# Altium schematic symbol library 724452_RPL-HX_Mobile_AEP_Rev0p91_Library.SchLib: 162 symbols (part 1 of 5) (continued)
## C_FERRITE (continued)
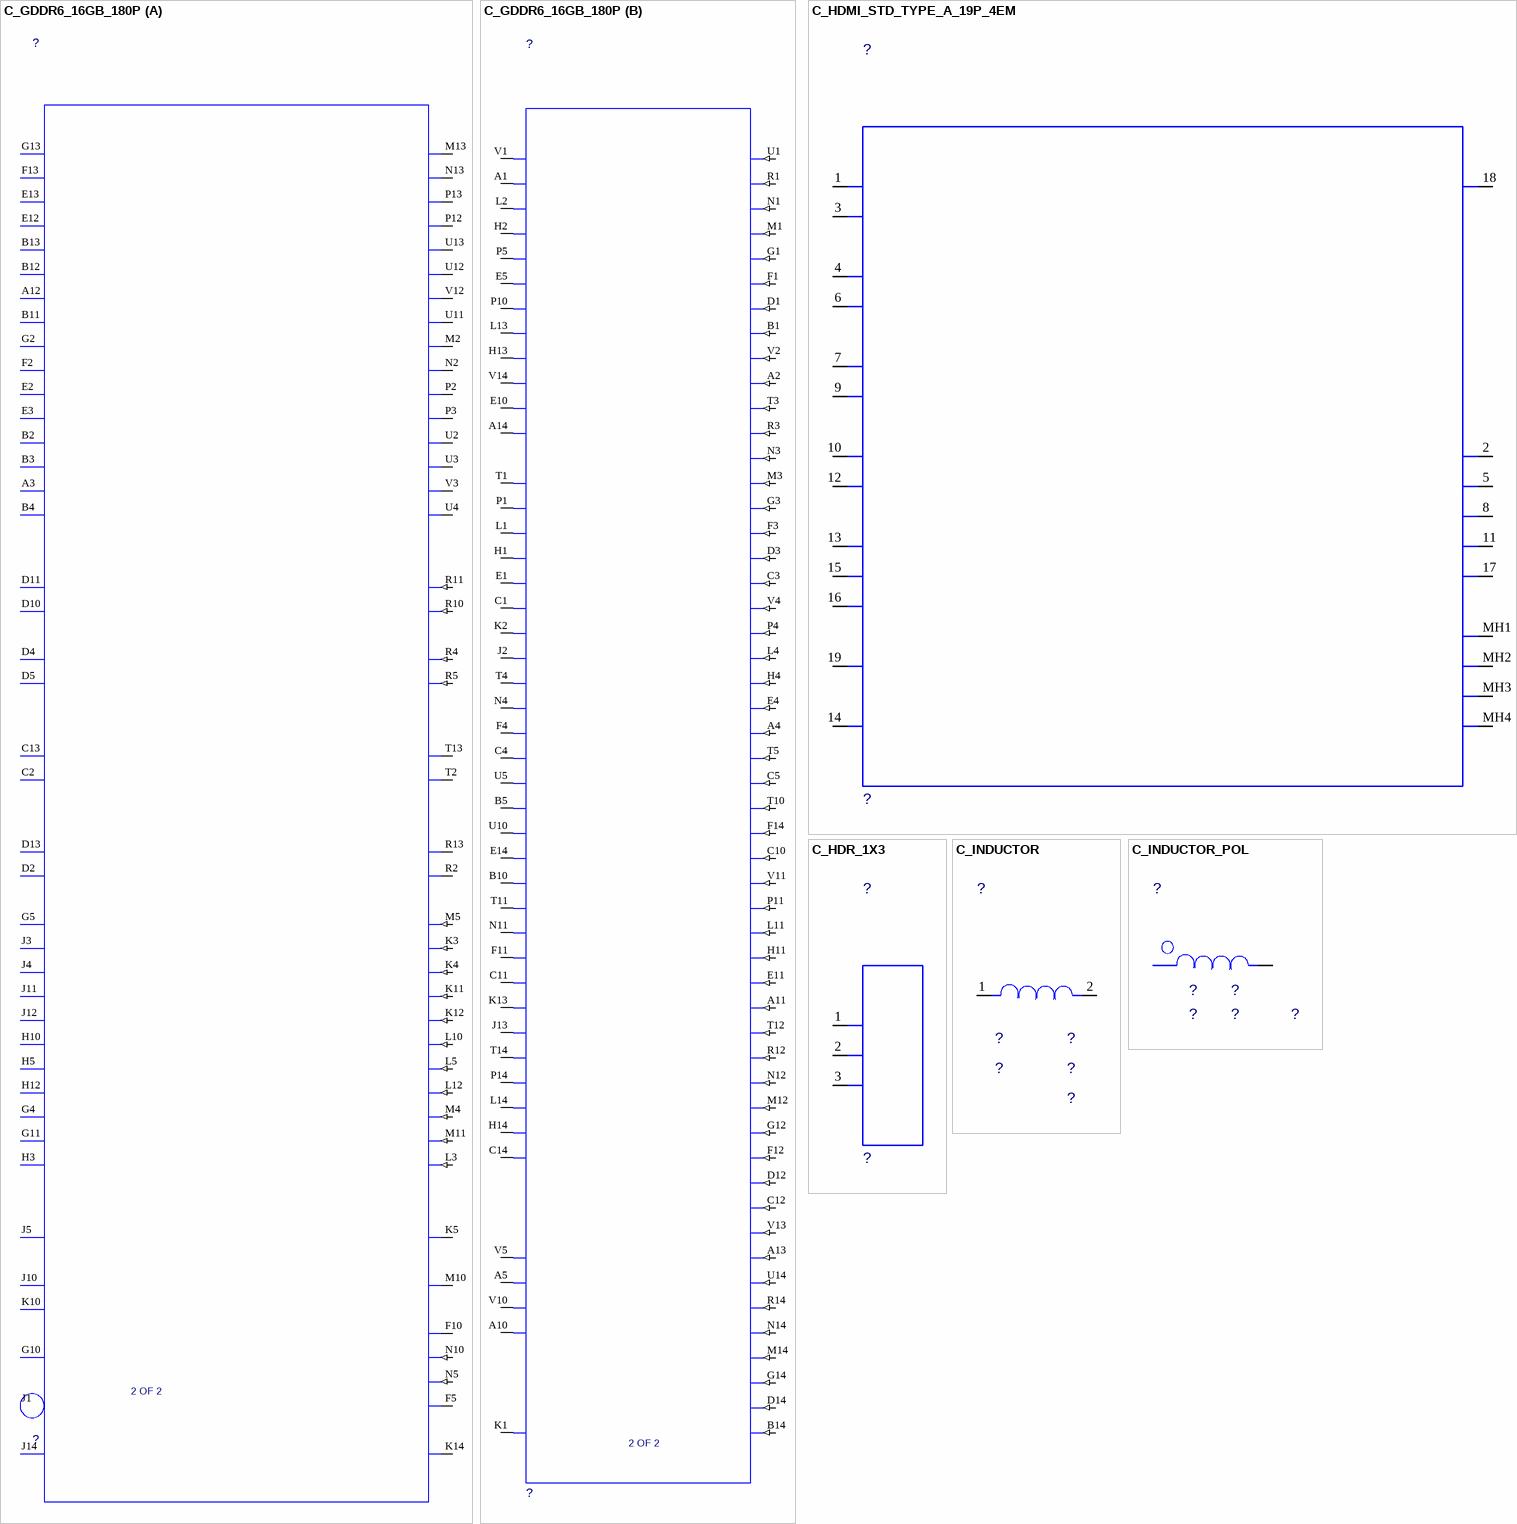
[diagram p5: symbols C_GDDR6_16GB_180P to C_INDUCTOR_POL]

## C_GDDR6_16GB_180P
designator ?  PART_SYM_NUM: 2 OF 2  (hidden comment: C_GDDR6_16GB_180P)
CDS_LMAN_SYM_OUTLINE: -250,1400,200,-1350; ROOM: NONE; OriginalSymbolOrigin: (-275,1400); FP_TECH: ?; IP: ?; MATERIAL: ?; PACK_TYPE: ?; PART_NUMBER: ?; VARIANT: ?
part A pins: A3 DQ01_A (io), A12 DQ09_A (io), B2 DQ03_A (io), B3 DQ02_A (io), B4 DQ00_A (io), B11 DQ08_A (io), B12 DQ10_A (io), B13 DQ11_A (io), C2 EDC0_A (io), C13 EDC1_A (io), D2 DBI0_N_A (io), D4 WCK0_T_A (in), D5 WCK0_C_A (in), D10 WCK1_C_A (in), D11 WCK1_T_A (in), D13 DBI1_N_A (io), E2 DQ05_A (io), E3 DQ04_A (io), E12 DQ12_A (io), E13 DQ13_A (io), F2 DQ06_A (io), F5 TMS (io), F10 TDI (io), F13 DQ14_A (io), G2 DQ07_A (io), G4 CA2_A (in), G5 CA10_A_NC (in), G10 CKE_N_A (io), G11 CA1_A (in), G13 DQ15_A (io), H3 CA0_A (in), H5 CA4_A (in), H10 CA5_A (in), H12 CA3_A (in), J1 RESET_N (io), J3 CA9_A (in), J4 CA8_A (in), J5 CABI_N_A (io), J10 CK_T (in), J11 CA7_A (in), J12 CA6_A (in), J14 ZQ_A (io), K3 CA9_B (in), K4 CA8_B (in), K5 CABI_N_B (io), K10 CK_C (in), K11 CA7_B (in), K12 CA6_B (in), K14 ZQ_B (io), L3 CA0_B (in), L5 CA4_B (in), L10 CA5_B (in), L12 CA3_B (in), M2 DQ07_B (io), M4 CA2_B (in), M5 CA10_B_NC (in), M10 CKE_N_B (io), M11 CA1_B (in), M13 DQ15_B (io), N2 DQ06_B (io), N5 TCK (in), N10 TDO (in), N13 DQ14_B (io), P2 DQ05_B (io), P3 DQ04_B (io), P12 DQ12_B (io), P13 DQ13_B (io), R2 DBI0_N_B (io), R4 WCK0_T_B (in), R5 WCK0_C_B (in), R10 WCK1_C_B (in), R11 WCK1_T_B (in), R13 DBI1_N_B (io), T2 EDC0_B (io), T13 EDC1_B (io), U2 DQ03_B (io), U3 DQ02_B (io), U4 DQ00_B (io), U11 DQ08_B (io), U12 DQ10_B (io), U13 DQ11_B (io), V3 DQ01_B (io), V12 DQ09_B (io)
part B pins: A1 VDD_02 (power), A2 VSS_10 (in), A4 VSS_24 (in), A5 VPP_02 (power), A10 VPP_04 (power), A11 VSS_35 (in), A13 VSS_45 (in), A14 VDD_12 (power), B1 VSS_08 (in), B5 VDDQ_14 (power), B10 VDDQ_17 (power), B14 VSS_52 (in), C1 VDDQ_06 (power), C3 VSS_18 (in), C4 VDDQ_12 (power), C5 VSS_26 (in), C10 VSS_29 (in), C11 VDDQ_21 (power), C12 VSS_43 (in), C14 VDDQ_28 (power), D1 VSS_07 (in), D3 VSS_17 (in), D12 VSS_42 (in), D14 VSS_51 (in), E1 VDDQ_05 (power), E4 VSS_23 (in), E5 VDD_06 (power), E10 VDD_11 (power), E11 VSS_34 (in), E14 VDDQ_16 (power), F1 VSS_06 (in), F3 VSS_16 (in), F4 VDDQ_11 (power), F11 VDDQ_20 (power), F12 VSS_41 (in), F14 VSS_28 (in), G1 VSS_05 (in), G3 VSS_15 (in), G12 VSS_40 (in), G14 VSS_50 (in), H1 VDDQ_04 (power), H2 VDD_04 (power), H4 VSS_22 (in), H11 VSS_33 (in), H13 VDD_09 (power), H14 VDDQ_27 (power), J2 VDDQ_08 (power), J13 VDDQ_23 (power), K1 VREFC (power), K2 VDDQ_07 (power), K13 VDDQ_22 (power), L1 VDDQ_03 (power), L2 VDD_03 (power), L4 VSS_21 (in), L11 VSS_32 (in), L13 VDD_08 (power), L14 VDDQ_26 (power), M1 VSS_04 (in), M3 VSS_14 (in), M12 VSS_39 (in), M14 VSS_49 (in), N1 VSS_03 (in), N3 VSS_13 (in), N4 VDDQ_10 (power), N11 VDDQ_19 (power), N12 VSS_38 (in), N14 VSS_48 (in), P1 VDDQ_02 (power), P4 VSS_20 (in), P5 VDD_05 (power), P10 VDD_07 (power), P11 VSS_31 (in), P14 VDDQ_25 (power), R1 VSS_02 (in), R3 VSS_12 (in), R12 VSS_37 (in), R14 VSS_47 (in), T1 VDDQ_01 (power), T3 VSS_11 (in), T4 VDDQ_09 (power), T5 VSS_25 (in), T10 VSS_27 (in), T11 VDDQ_18 (power), T12 VSS_36 (in), T14 VDDQ_24 (power), U1 VSS_01 (in), U5 VDDQ_13 (power), U10 VDDQ_15 (power), U14 VSS_46 (in), V1 VDD_01 (power), V2 VSS_09 (in), V4 VSS_19 (in), V5 VPP_01 (power), V10 VPP_03 (power), V11 VSS_30 (in), V13 VSS_44 (in), V14 VDD_10 (power)

## C_HDMI_STD_TYPE_A_19P_4EM
designator ?  (value not drawn)
CDS_LMAN_SYM_OUTLINE: -500,550,500,-550; ROOM: NONE; OriginalSymbolOrigin: (-525,550); FP_TECH: ?; IP: ?; PACK_TYPE: ?; VARIANT: ?; MATERIAL: ?; PART_NUMBER: ?
pins: 1 TMDS_DATA2_DP (io), 2 TMDS_DATA2_SHIELD (io), 3 TMDS_DATA2_DN (io), 4 TMDS_DATA1_DP (io), 5 TMDS_DATA1_SHIELD (io), 6 TMDS_DATA1_DN (io), 7 TMDS_DATA0_DP (io), 8 TMDS_DATA0_SHIELD (io), 9 TMDS_DATA0_DN (io), 10 TMDS_CLK_DP (io), 11 TMDS_CLK_SHIELD (io), 12 TMDS_CLK_DN (io), 13 CEC (io), 14 RESERVED_UTILITY_HEAC_P (io), 15 SCL (io), 16 SDA (io), 17 DDC_HEC_CEC_GND (io), 18 5V_P (power), 19 HOT_PLUG_DETECT_HEC_DATA_M (io), MH1 (io), MH2 (io), MH3 (io), MH4 (io)

## C_HDR_1X3
designator ?  (value not drawn)
CDS_LMAN_SYM_OUTLINE: -50,150,50,-150; ROOM: NONE; OriginalSymbolOrigin: (-75,150); FP_TECH: ?; IP: ?; MATERIAL: ?; PACK_TYPE: ?; PART_NUMBER: ?; VARIANT: ?
pins: 1 IO1 (io), 2 IO2 (io), 3 IO3 (io)

## C_INDUCTOR
designator ?, comment ?
CDS_LMAN_SYM_OUTLINE: -100,50,100,-50; ROOM: NONE; OriginalSymbolOrigin: (-75,25); CURRENT: ?; FP_TECH: ?; IP: ?; MATERIAL: ?; PACK_TYPE: ?; PART_NUMBER: ?; TOLERANCE: ?; VARIANT: ?
pins: 1 INA (io), 2 INB (io)

## C_INDUCTOR_POL
designator ?, comment ?
CDS_LMAN_SYM_OUTLINE: -100,50,100,-50; ROOM: NONE; OriginalSymbolOrigin: (-100,50); CURRENT: ?; FP_TECH: ?; IP: ?; MATERIAL: ?; PACK_TYPE: ?; PART_NUMBER: ?; TOLERANCE: ?; VARIANT: ?
pins: 1 A (io), 2 B (io)

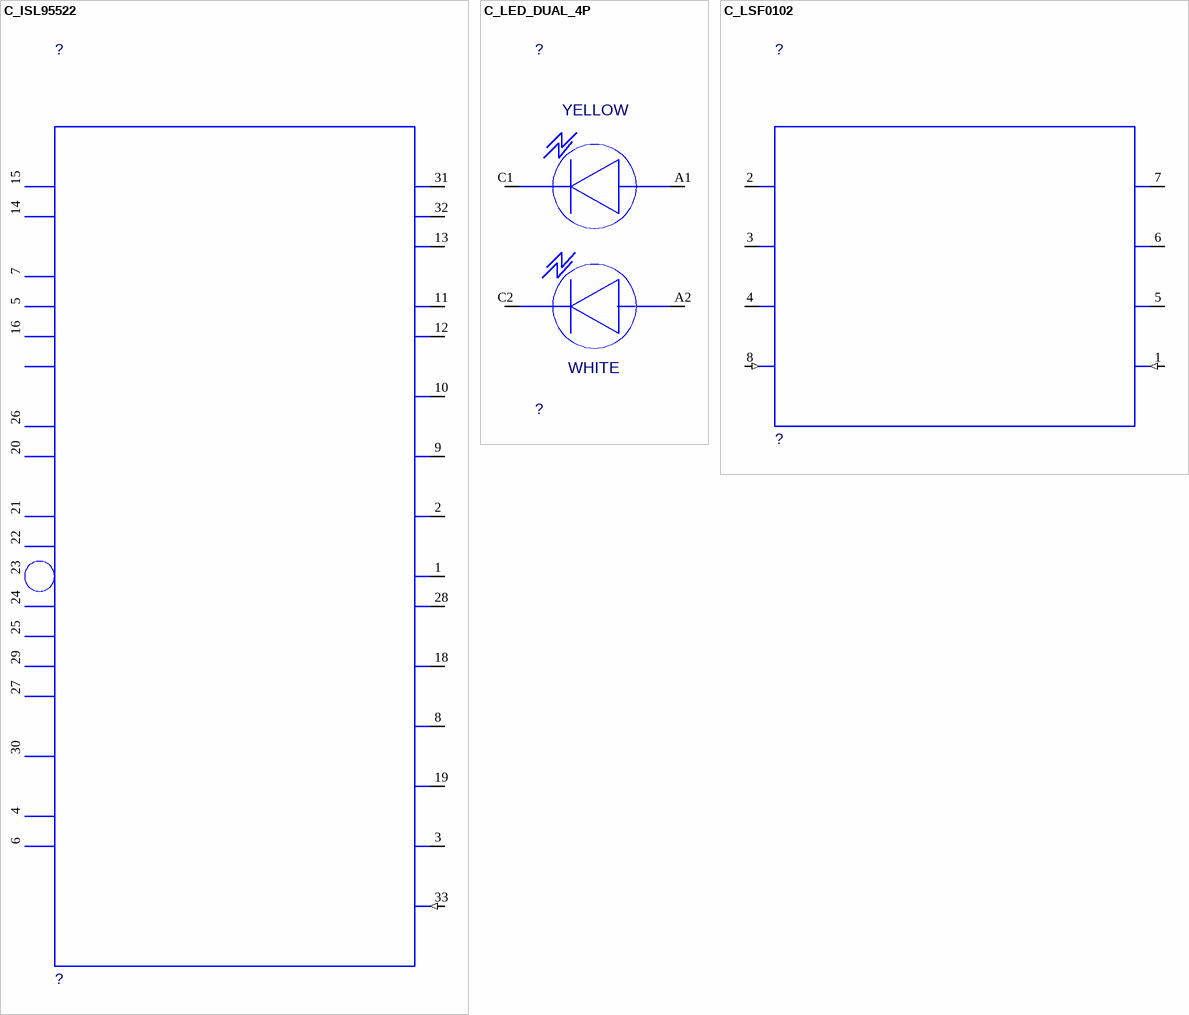
[diagram p6: symbols C_ISL95522 to C_LSF0102]

## C_ISL95522
designator ?  (value not drawn)
CDS_LMAN_SYM_OUTLINE: -300,700,300,-700; ROOM: NONE; OriginalSymbolOrigin: (-350,700); FP_TECH: ?; IP: ?; MATERIAL: ?; PACK_TYPE: ?; PART_NUMBER: ?; VARIANT: ?
pins: 1 CSON (io), 2 CSOP (io), 3 FSET (io), 4 QPCP (io), 5 CMSRC (io), 6 QPCN (io), 7 ASGATE (io), 8 VDDP (power), 9 LGATE (io), 10 PHASE (io), 11 UGATE (io), 12 BOOT (power), 13 NTC (io), 14 CSIN (io), 15 CSIP (io), 16 ACIN (io), 17 DCIN (power) hidden to DCIN, 18 VDD (power), 19 PROG (io), 20 ACLIM (io), 21 SDA (io), 22 SCL (io), 23 PROCHOT_N (io), 24 ACOK (io), 25 BATGONE (io), 26 CCLIM (io), 27 BMON (io), 28 COMP (io), 29 AMON (io), 30 PSYS (io), 31 VBAT (power), 32 BGATE (io), 33 GND_TPD (in)

## C_LED_DUAL_4P
designator ?  (value not drawn)
CDS_LMAN_SYM_OUTLINE: -100,250,100,-250; ROOM: NONE; OriginalSymbolOrigin: (-125,200); FP_TECH: ?; IP: ?; MATERIAL: ?; PACK_TYPE: ?; PART_NUMBER: ?; VARIANT: ?
pins: A1 CA1 (io), A2 CA2 (io), C1 CC1 (io), C2 CC2 (io)
text: YELLOW; WHITE

## C_LSF0102
designator ?  (value not drawn)
CDS_LMAN_SYM_OUTLINE: -300,250,300,-250; ROOM: NONE; OriginalSymbolOrigin: (-325,250); FP_TECH: ?; IP: ?; MATERIAL: ?; PACK_TYPE: ?; PART_NUMBER: ?; VARIANT: ?
pins: 1 GND (in), 2 VREF_A (power), 3 A1 (io), 4 A2 (io), 5 B2 (io), 6 B1 (io), 7 VREF_B (power), 8 EN (in)

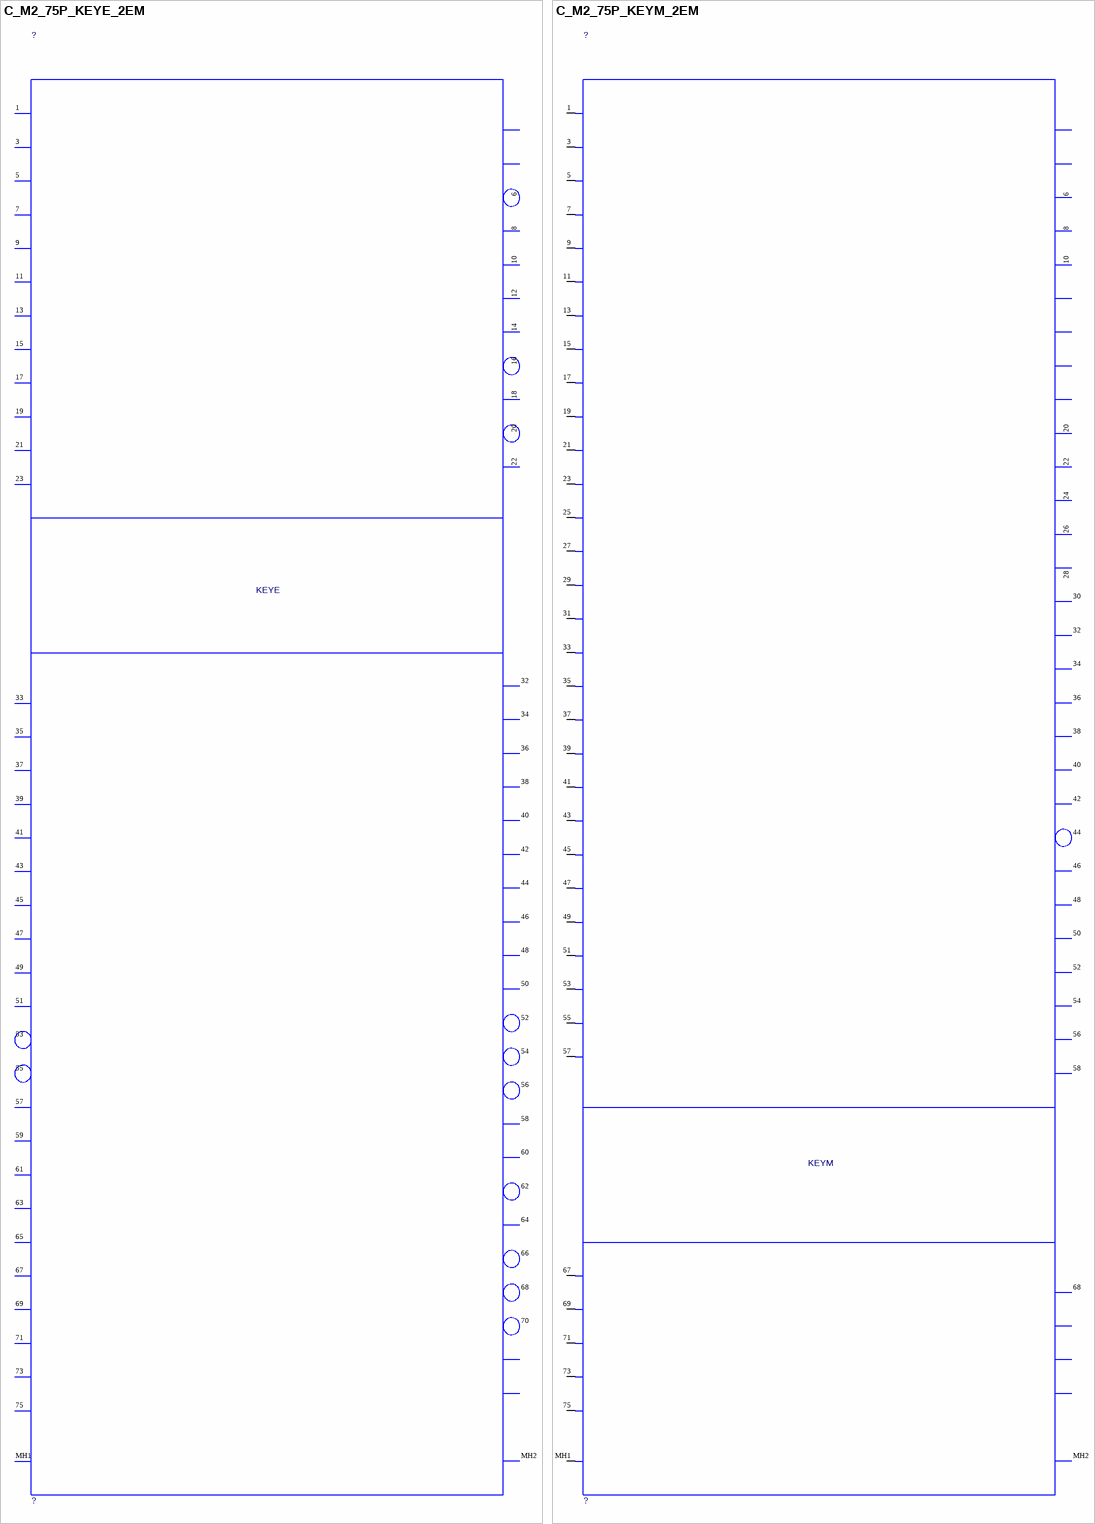
[diagram p7: symbols C_M2_75P_KEYE_2EM to C_M2_75P_KEYM_2EM]

## C_M2_75P_KEYE_2EM
designator ?  (value not drawn)
CDS_LMAN_SYM_OUTLINE: -700,2100,700,-2100; ROOM: NONE; OriginalSymbolOrigin: (-750,2100); FP_TECH: ?; IP: ?; MATERIAL: ?; PACK_TYPE: ?; PART_NUMBER: ?; VARIANT: ?
pins: 1 GND_1 (io), 2 3P3V_2 (power) hidden to 3P3V_2, 3 USB_DP (io), 4 3P3V_4 (power) hidden to 3P3V_4, 5 USB_DN (io), 6 LED_1_N (io), 7 GND_7 (io), 8 PCM_CLK_I2S_SCK (io), 9 SDIO_CLK_SYSCLK (io), 10 PCM_SYNC_I2S_WS (io), 11 SDIO_CMD (io), 12 PCM_IN_I2S_SD_IN (io), 13 SDIO_DATA0 (io), 14 PCM_OUT_I2S_SD_OUT (io), 15 SDIO_DATA1 (io), 16 LED_2_N (io), 17 SDIO_DATA2 (io), 18 GND_18 (io), 19 SDIO_DATA3 (io), 20 UART_WAKE_N (io), 21 SDIO_WAKE_N (io), 22 UART_RXD (io), 23 SDIO_RESET_TX_BLANKING_N (io), 32 UART_TXD (io), 33 GND_33 (io), 34 UART_CTS (io), 35 PETP0 (io), 36 UART_RTS (io), 37 PETN0 (io), 38 VENDOR_DEFINED_38 (io), 39 GND_39 (io), 40 VENDOR_DEFINED_40 (io), 41 PERP0 (io), 42 VENDOR_DEFINED_42 (io), 43 PERN0 (io), 44 COEX3 (io), 45 GND_45 (io), 46 COEX_RXD (io), 47 REFCLKP0 (io), 48 COEX_TXD (io), 49 REFCLKN0 (io), 50 SUSCLK (io), 51 GND_51 (io), 52 PERST0_N (io), 53 CLKREQ0_N (io), 54 W_DISABLE2_N (io), 55 PEWAKE0_N (io), 56 W_DISABLE1_N (io), 57 GND_57 (io), 58 I2C_DATA (io), 59 RESERVED_PETP1 (io), 60 I2C_CLK (io), 61 RESERVED_PETN1 (io), 62 ALERT_N (io), 63 GND_63 (io), 64 RESERVED (io), 65 RESERVED_PERP1 (io), 66 UIM_SWP_PERST1_N (io), 67 RESERVED_PERN1 (io), 68 UIM_POWER_SNK_CLKREQ1_N (io), 69 GND_69 (io), 70 UIM_POWER_SRC_GPIO_1_PEWAKE1_N (io), 71 RESERVED_REFCLKP1 (io), 72 3P3V_72 (power) hidden to 3P3V_72, 73 RESERVED_REFCLKN1 (io), 74 3P3V_74 (power) hidden to 3P3V_74, 75 GND_75 (io), MH1 (io), MH2 (io)
text: KEYE

## C_M2_75P_KEYM_2EM
designator ?  (value not drawn)
CDS_LMAN_SYM_OUTLINE: -700,2100,700,-2100; ROOM: NONE; OriginalSymbolOrigin: (-725,2100); FP_TECH: ?; IP: ?; MATERIAL: ?; PACK_TYPE: ?; PART_NUMBER: ?; VARIANT: ?
pins: 1 GND_1 (io), 2 3P3V_2 (power) hidden to 3P3V_2, 3 GND_3 (io), 4 3P3V_4 (power) hidden to 3P3V_4, 5 PERN3 (io), 6 NC_6 (io), 7 PERP3 (io), 8 NC_8 (io), 9 GND_9 (io), 10 DAS_DSS_LED_1_N (io), 11 PETN3 (io), 12 3P3V_12 (power) hidden to 3P3V_12, 13 PETP3 (io), 14 3P3V_14 (power) hidden to 3P3V_14, 15 GND_15 (io), 16 3P3V_16 (power) hidden to 3P3V_16, 17 PERN2 (io), 18 3P3V_18 (power) hidden to 3P3V_18, 19 PERP2 (io), 20 NC_20 (io), 21 GND_21 (io), 22 NC_22 (io), 23 PETN2 (io), 24 NC_24 (io), 25 PETP2 (io), 26 NC_26 (io), 27 GND_27 (io), 28 NC_28 (io), 29 PERN1 (io), 30 NC_30 (io), 31 PERP1 (io), 32 NC_32 (io), 33 GND_33 (io), 34 NC_34 (io), 35 PETN1 (io), 36 NC_36 (io), 37 PETP1 (io), 38 DEVSLP (io), 39 GND_39 (io), 40 SMB_CLK (io), 41 PERN0_SATA_BP (io), 42 SMB_DATA (io), 43 PERP0_SATA_BN (io), 44 ALERT_N (io), 45 GND_45 (io), 46 NC_46 (io), 47 PETN0_SATA_AN (io), 48 NC_48 (io), 49 PETP0_SATA_AP (io), 50 PERST_N_NC (io), 51 GND_51 (io), 52 CLKREQ_N_NC (io), 53 REFCLKN (io), 54 PEWAKE_N_NC (io), 55 REFCLKP (io), 56 NC_56 (io), 57 GND_57 (io), 58 NC_58 (io), 67 NC_67 (io), 68 SUSCLK (io), 69 PEDET_NC_PCIE_GND_SATA (io), 70 3P3V_70 (power) hidden to 3P3V_70, 71 GND_71 (io), 72 3P3V_72 (power) hidden to 3P3V_72, 73 GND_73 (io), 74 3P3V_74 (power) hidden to 3P3V_74, 75 GND_75 (io), MH1 (io), MH2 (io)
text: KEYM

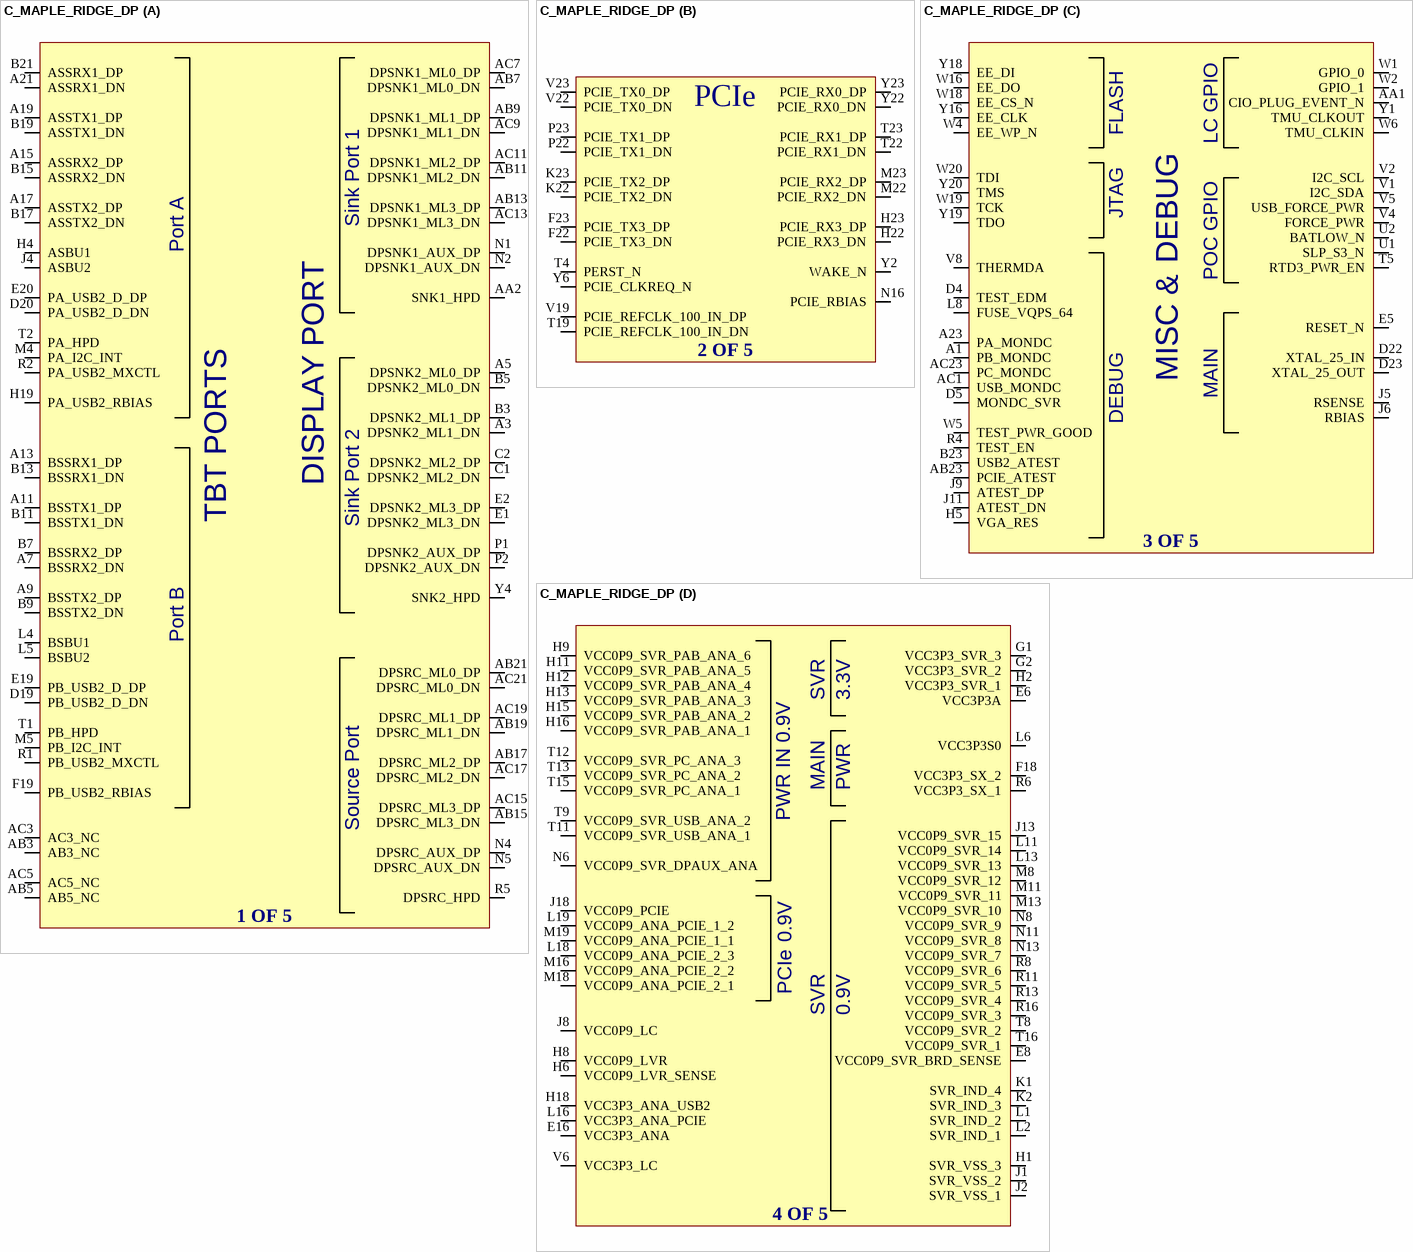
[diagram p8: symbol C_MAPLE_RIDGE_DP]

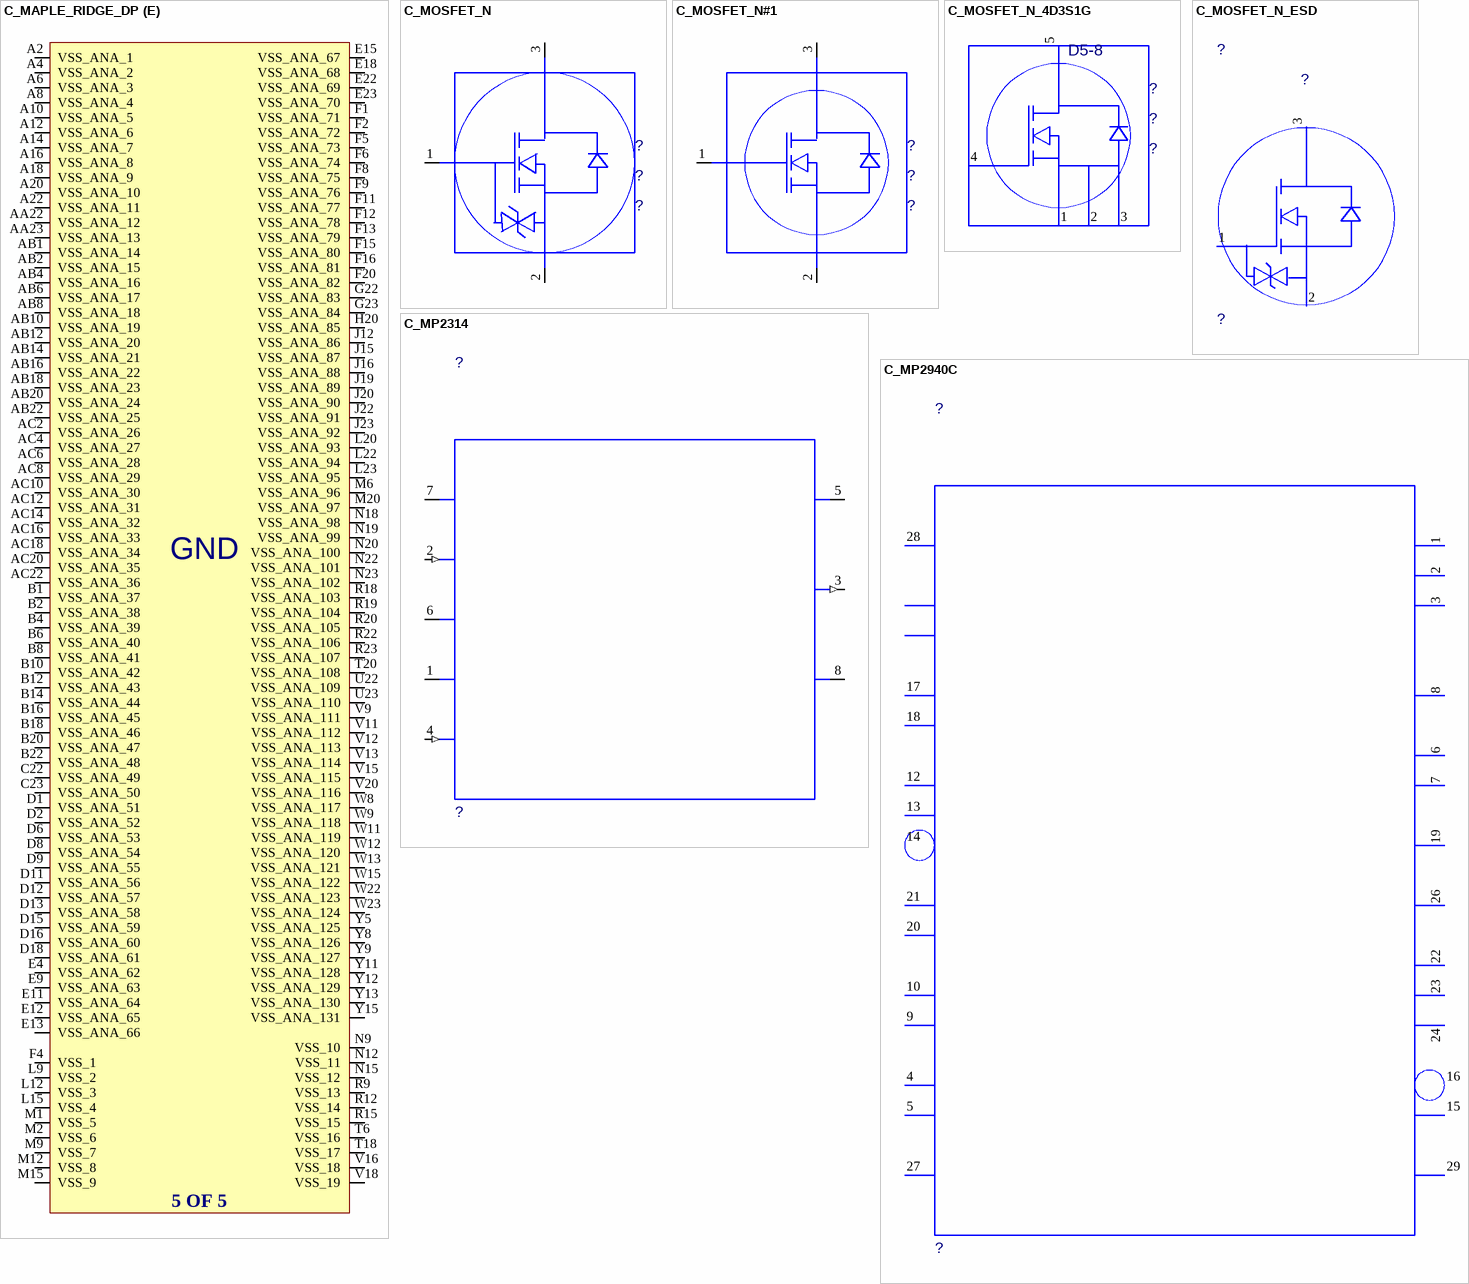
[diagram p9: symbols C_MAPLE_RIDGE_DP to C_MP2940C]

## C_MAPLE_RIDGE_DP
designator ?  (value not drawn)
Case/Package: *; Manufacturer Part Number: *
part A pins: A3 DPSNK2_ML1_DN, A5 DPSNK2_ML0_DP, A7 BSSRX2_DN, A9 BSSTX2_DP, A11 BSSTX1_DP, A13 BSSRX1_DP, A15 ASSRX2_DP, A17 ASSTX2_DP, A19 ASSTX1_DP, A21 ASSRX1_DN, AA2 SNK1_HPD, AB3 AB3_NC, AB5 AB5_NC, AB7 DPSNK1_ML0_DN, AB9 DPSNK1_ML1_DP, AB11 DPSNK1_ML2_DN, AB13 DPSNK1_ML3_DP, AB15 DPSRC_ML3_DN, AB17 DPSRC_ML2_DP, AB19 DPSRC_ML1_DN, AB21 DPSRC_ML0_DP, AC3 AC3_NC, AC5 AC5_NC, AC7 DPSNK1_ML0_DP, AC9 DPSNK1_ML1_DN, AC11 DPSNK1_ML2_DP, AC13 DPSNK1_ML3_DN, AC15 DPSRC_ML3_DP, AC17 DPSRC_ML2_DN, AC19 DPSRC_ML1_DP, AC21 DPSRC_ML0_DN, B3 DPSNK2_ML1_DP, B5 DPSNK2_ML0_DN, B7 BSSRX2_DP, B9 BSSTX2_DN, B11 BSSTX1_DN, B13 BSSRX1_DN, B15 ASSRX2_DN, B17 ASSTX2_DN, B19 ASSTX1_DN, B21 ASSRX1_DP, C1 DPSNK2_ML2_DN, C2 DPSNK2_ML2_DP, D19 PB_USB2_D_DN, D20 PA_USB2_D_DN, E1 DPSNK2_ML3_DN, E2 DPSNK2_ML3_DP, E19 PB_USB2_D_DP, E20 PA_USB2_D_DP, F19 PB_USB2_RBIAS, H4 ASBU1, H19 PA_USB2_RBIAS, J4 ASBU2, L4 BSBU1, L5 BSBU2, M4 PA_I2C_INT, M5 PB_I2C_INT, N1 DPSNK1_AUX_DP, N2 DPSNK1_AUX_DN, N4 DPSRC_AUX_DP, N5 DPSRC_AUX_DN, P1 DPSNK2_AUX_DP, P2 DPSNK2_AUX_DN, R1 PB_USB2_MXCTL, R2 PA_USB2_MXCTL, R5 DPSRC_HPD, T1 PB_HPD, T2 PA_HPD, Y4 SNK2_HPD
part B pins: F22 PCIE_TX3_DN, F23 PCIE_TX3_DP, H22 PCIE_RX3_DN, H23 PCIE_RX3_DP, K22 PCIE_TX2_DN, K23 PCIE_TX2_DP, M22 PCIE_RX2_DN, M23 PCIE_RX2_DP, N16 PCIE_RBIAS, P22 PCIE_TX1_DN, P23 PCIE_TX1_DP, T4 PERST_N, T19 PCIE_REFCLK_100_IN_DN, T22 PCIE_RX1_DN, T23 PCIE_RX1_DP, V19 PCIE_REFCLK_100_IN_DP, V22 PCIE_TX0_DN, V23 PCIE_TX0_DP, Y2 WAKE_N, Y6 PCIE_CLKREQ_N, Y22 PCIE_RX0_DN, Y23 PCIE_RX0_DP
part C pins: A1 PB_MONDC, A23 PA_MONDC, AA1 CIO_PLUG_EVENT_N, AB23 PCIE_ATEST, AC1 USB_MONDC, AC23 PC_MONDC, B23 USB2_ATEST, D4 TEST_EDM, D5 MONDC_SVR, D22 XTAL_25_IN, D23 XTAL_25_OUT, E5 RESET_N, H5 VGA_RES, J5 RSENSE, J6 RBIAS, J9 ATEST_DP, J11 ATEST_DN, L8 FUSE_VQPS_64 (power) hidden to FUSE_VQPS_64, L8 FUSE_VQPS_64, R4 TEST_EN, T5 RTD3_PWR_EN, U1 SLP_S3_N, U2 BATLOW_N, V1 I2C_SDA, V2 I2C_SCL, V4 FORCE_PWR, V5 USB_FORCE_PWR, V8 THERMDA, W1 GPIO_0, W2 GPIO_1, W4 EE_WP_N, W5 TEST_PWR_GOOD, W6 TMU_CLKIN, W16 EE_DO, W18 EE_CS_N, W19 TCK, W20 TDI, Y1 TMU_CLKOUT, Y16 EE_CLK, Y18 EE_DI, Y19 TDO, Y20 TMS
part D pins: E6 VCC3P3A (power), E8 VCC0P9_SVR_BRD_SENSE (power), E16 VCC3P3_ANA (power), F18 VCC3P3_SX_2 (power), G1 VCC3P3_SVR_3 (power), G2 VCC3P3_SVR_2 (power), H1 SVR_VSS_3 (power), H2 VCC3P3_SVR_1 (power), H6 VCC0P9_LVR_SENSE (power), H8 VCC0P9_LVR (power), H9 VCC0P9_SVR_PAB_ANA_6 (power), H11 VCC0P9_SVR_PAB_ANA_5 (power), H12 VCC0P9_SVR_PAB_ANA_4 (power), H13 VCC0P9_SVR_PAB_ANA_3 (power), H15 VCC0P9_SVR_PAB_ANA_2 (power), H16 VCC0P9_SVR_PAB_ANA_1 (power), H18 VCC3P3_ANA_USB2 (power), J1 SVR_VSS_2 (power), J2 SVR_VSS_1 (power), J8 VCC0P9_LC (power), J13 VCC0P9_SVR_15 (power), J18 VCC0P9_PCIE (power), K1 SVR_IND_4 (power), K2 SVR_IND_3 (power), L1 SVR_IND_2 (power), L2 SVR_IND_1 (power), L6 VCC3P3S0 (power), L11 VCC0P9_SVR_14 (power), L13 VCC0P9_SVR_13 (power), L16 VCC3P3_ANA_PCIE (power), L18 VCC0P9_ANA_PCIE_2_3 (power), L19 VCC0P9_ANA_PCIE_1_2 (power), M8 VCC0P9_SVR_12 (power), M11 VCC0P9_SVR_11 (power), M13 VCC0P9_SVR_10 (power), M16 VCC0P9_ANA_PCIE_2_2 (power), M18 VCC0P9_ANA_PCIE_2_1 (power), M19 VCC0P9_ANA_PCIE_1_1 (power), N6 VCC0P9_SVR_DPAUX_ANA (power), N8 VCC0P9_SVR_9 (power), N11 VCC0P9_SVR_8 (power), N13 VCC0P9_SVR_7 (power), R6 VCC3P3_SX_1 (power), R8 VCC0P9_SVR_6 (power), R11 VCC0P9_SVR_5 (power), R13 VCC0P9_SVR_4 (power), R16 VCC0P9_SVR_3 (power), T8 VCC0P9_SVR_2 (power), T9 VCC0P9_SVR_USB_ANA_2 (power), T11 VCC0P9_SVR_USB_ANA_1 (power), T12 VCC0P9_SVR_PC_ANA_3 (power), T13 VCC0P9_SVR_PC_ANA_2 (power), T15 VCC0P9_SVR_PC_ANA_1 (power), T16 VCC0P9_SVR_1 (power), V6 VCC3P3_LC (power)
part E pins: A2 VSS_ANA_1, A4 VSS_ANA_2, A6 VSS_ANA_3, A8 VSS_ANA_4, A10 VSS_ANA_5, A12 VSS_ANA_6, A14 VSS_ANA_7, A16 VSS_ANA_8, A18 VSS_ANA_9, A20 VSS_ANA_10, A22 VSS_ANA_11, AA22 VSS_ANA_12, AA23 VSS_ANA_13, AB1 VSS_ANA_14, AB2 VSS_ANA_15, AB4 VSS_ANA_16, AB6 VSS_ANA_17, AB8 VSS_ANA_18, AB10 VSS_ANA_19, AB12 VSS_ANA_20, AB14 VSS_ANA_21, AB16 VSS_ANA_22, AB18 VSS_ANA_23, AB20 VSS_ANA_24, AB22 VSS_ANA_25, AC2 VSS_ANA_26, AC4 VSS_ANA_27, AC6 VSS_ANA_28, AC8 VSS_ANA_29, AC10 VSS_ANA_30, AC12 VSS_ANA_31, AC14 VSS_ANA_32, AC16 VSS_ANA_33, AC18 VSS_ANA_34, AC20 VSS_ANA_35, AC22 VSS_ANA_36, B1 VSS_ANA_37, B2 VSS_ANA_38, B4 VSS_ANA_39, B6 VSS_ANA_40, B8 VSS_ANA_41, B10 VSS_ANA_42, B12 VSS_ANA_43, B14 VSS_ANA_44, B16 VSS_ANA_45, B18 VSS_ANA_46, B20 VSS_ANA_47, B22 VSS_ANA_48, C22 VSS_ANA_49, C23 VSS_ANA_50, D1 VSS_ANA_51, D2 VSS_ANA_52, D6 VSS_ANA_53, D8 VSS_ANA_54, D9 VSS_ANA_55, D11 VSS_ANA_56, D12 VSS_ANA_57, D13 VSS_ANA_58, D15 VSS_ANA_59, D16 VSS_ANA_60, D18 VSS_ANA_61, E4 VSS_ANA_62, E9 VSS_ANA_63, E11 VSS_ANA_64, E12 VSS_ANA_65, E13 VSS_ANA_66, E15 VSS_ANA_67, E18 VSS_ANA_68, E22 VSS_ANA_69, E23 VSS_ANA_70, F1 VSS_ANA_71, F2 VSS_ANA_72, F4 VSS_1, F5 VSS_ANA_73, F6 VSS_ANA_74, F8 VSS_ANA_75, F9 VSS_ANA_76, F11 VSS_ANA_77, F12 VSS_ANA_78, F13 VSS_ANA_79, F15 VSS_ANA_80, F16 VSS_ANA_81, F20 VSS_ANA_82, G22 VSS_ANA_83, G23 VSS_ANA_84, H20 VSS_ANA_85, J12 VSS_ANA_86, J15 VSS_ANA_87, J16 VSS_ANA_88, J19 VSS_ANA_89, J20 VSS_ANA_90, J22 VSS_ANA_91, J23 VSS_ANA_92, L9 VSS_2, L12 VSS_3, L15 VSS_4, L20 VSS_ANA_93, L22 VSS_ANA_94, L23 VSS_ANA_95, M1 VSS_5, M2 VSS_6, M6 VSS_ANA_96, M9 VSS_7, M12 VSS_8, M15 VSS_9, M20 VSS_ANA_97, N9 VSS_10, N12 VSS_11, N15 VSS_12, N18 VSS_ANA_98, N19 VSS_ANA_99, N20 VSS_ANA_100, N22 VSS_ANA_101, N23 VSS_ANA_102, R9 VSS_13, R12 VSS_14, R15 VSS_15, R18 VSS_ANA_103, R19 VSS_ANA_104, R20 VSS_ANA_105, R22 VSS_ANA_106, R23 VSS_ANA_107, T6 VSS_16, T18 VSS_17, T20 VSS_ANA_108, U22 VSS_ANA_109, U23 VSS_ANA_110, V9 VSS_ANA_111, V11 VSS_ANA_112, V12 VSS_ANA_113, V13 VSS_ANA_114, V15 VSS_ANA_115, V16 VSS_18, V18 VSS_19, V20 VSS_ANA_116, W8 VSS_ANA_117, W9 VSS_ANA_118, W11 VSS_ANA_119, W12 VSS_ANA_120, W13 VSS_ANA_121, W15 VSS_ANA_122, W22 VSS_ANA_123, W23 VSS_ANA_124, Y5 VSS_ANA_125, Y8 VSS_ANA_126, Y9 VSS_ANA_127, Y11 VSS_ANA_128, Y12 VSS_ANA_129, Y13 VSS_ANA_130, Y15 VSS_ANA_131
part A text: Sink Port 1; Port A; DISPLAY PORT; Sink Port 2; TBT PORTS; Port B; Source Port; 1 OF 5
part B text: PCIe; 2 OF 5
part C text: FLASH; LC GPIO; JTAG; DEBUG; POC GPIO; MISC &; MAIN; 3 OF 5
part D text: 3.3V; SVR; PWR IN 0.9V; PWR; MAIN; 0.9V; PCIe; 4 OF 5
part E text: GND; 5 OF 5

## C_MOSFET_N
designator ?, comment ?
CDS_LMAN_SYM_OUTLINE: -150,150,150,-150; ROOM: NONE; OriginalSymbolOrigin: (-175,175); FP_TECH: ?; IP: ?; MATERIAL: ?; PACK_TYPE: ?; PART_NUMBER: ?; VARIANT: ?
pins: 1 G (io), 2 S (io), 3 D (io)

## C_MOSFET_N#1
designator ?, comment ?
CDS_LMAN_SYM_OUTLINE: -150,150,150,-150; ROOM: NONE; OriginalSymbolOrigin: (-175,175); FP_TECH: ?; IP: ?; MATERIAL: ?; PACK_TYPE: ?; PART_NUMBER: ?; VARIANT: ?
pins: 1 G (io), 2 S (io), 3 D (io)

## C_MOSFET_N_4D3S1G
designator ?, comment ?
CDS_LMAN_SYM_OUTLINE: -150,150,150,-150; ROOM: NONE; OriginalSymbolOrigin: (-150,150); FP_TECH: ?; IP: ?; PACK_TYPE: ?; VARIANT: ?; MATERIAL: ?; PART_NUMBER: ?
pins: 1 S1 (io), 2 S2 (io), 3 S3 (io), 4 G (io), 5 D (io)
text: D5-8

## C_MOSFET_N_ESD
designator ?, comment ?
CDS_LMAN_SYM_OUTLINE: -150,150,150,-150; ROOM: NONE; OriginalSymbolOrigin: (-150,150); FP_TECH: ?; IP: ?; PACK_TYPE: ?; VARIANT: ?; MATERIAL: ?; PART_NUMBER: ?
pins: 1 G (io), 2 S (io), 3 D (io)

## C_MP2314
designator ?  (value not drawn)
CDS_LMAN_SYM_OUTLINE: -300,300,300,-300; ROOM: NONE; OriginalSymbolOrigin: (-325,300); FP_TECH: ?; IP: ?; PACK_TYPE: ?; VARIANT: ?; MATERIAL: ?; PART_NUMBER: ?
pins: 1 AAM (io), 2 IN (in), 3 SW (out), 4 GND (in), 5 BST (io), 6 EN_SYNC (io), 7 VCC (power), 8 FB (io)

## C_MP2940C
designator ?  (value not drawn)
CDS_LMAN_SYM_OUTLINE: -400,650,400,-600; ROOM: NONE; OriginalSymbolOrigin: (-450,650); FP_TECH: ?; IP: ?; PACK_TYPE: ?; VARIANT: ?; MATERIAL: ?; PART_NUMBER: ?
pins: 1 CS3 (in), 2 CS2 (in), 3 CS1 (in), 4 VDIFF (out), 5 VFB (io), 6 VOSEN (in), 7 VORTN (in), 8 CSSUM (in), 9 IMON (io), 10 IREF (io), 11 VDD18 (power) hidden to VDD18, 12 SCLK_VID0 (in), 13 SDIO_VID1 (io), 14 ALT_N (out), 15 VRRDY (out), 16 VRHOT_N (out), 17 SDA_P (io), 18 SCL_P (in), 19 STB (out), 20 PE (in), 21 EN (in), 22 PWM3 (out), 23 PWM2 (out), 24 PWM1 (out), 25 VDD33 (power) hidden to VDD33, 26 TEMP (in), 27 PSYS (in), 28 VIN_SEN (in), 29 AGND_TPD (in)

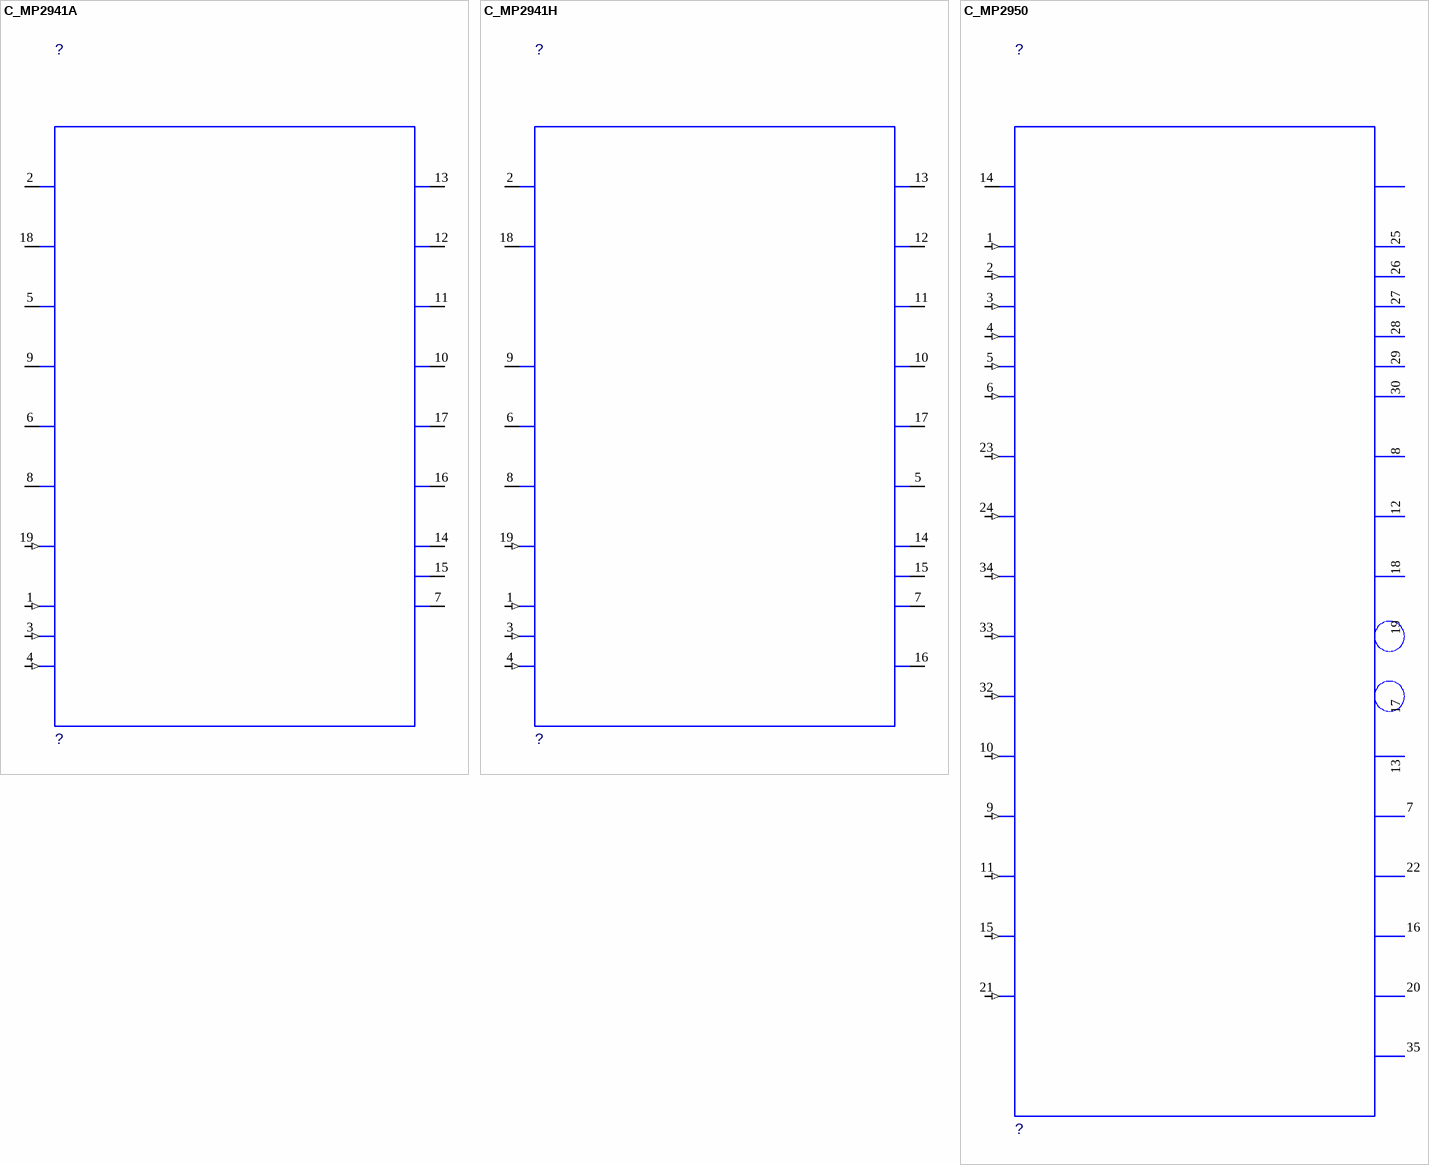
[diagram p10: symbols C_MP2941A to C_MP2950]

## C_MP2941A
designator ?  (value not drawn)
CDS_LMAN_SYM_OUTLINE: -300,500,300,-500; ROOM: NONE; OriginalSymbolOrigin: (-325,500); FP_TECH: ?; IP: ?; MATERIAL: ?; PACK_TYPE: ?; PART_NUMBER: ?; VARIANT: ?
pins: 1 PGND_1 (in), 2 VIN (power), 3 PGND_2 (in), 4 PGND_3 (in), 5 VID (power), 6 SS (io), 7 FS (io), 8 EN (io), 9 PG (io), 10 BST2 (io), 11 SW2 (io), 12 SW1 (io), 13 BST1 (io), 14 CLM (io), 15 MODE (io), 16 VOUT (power), 17 FB (io), 18 3V3 (power), 19 AGND (in)

## C_MP2941H
designator ?  (value not drawn)
CDS_LMAN_SYM_OUTLINE: -300,500,300,-500; ROOM: NONE; OriginalSymbolOrigin: (-325,500); FP_TECH: ?; IP: ?; MATERIAL: ?; PACK_TYPE: ?; PART_NUMBER: ?; VARIANT: ?
pins: 1 PGND_1 (in), 2 VIN (power), 3 PGND_2 (in), 4 PGND_3 (in), 5 TONEXT (io), 6 SS (io), 7 FS (io), 8 EN (io), 9 PG (io), 10 BST2 (io), 11 SW2 (io), 12 SW1 (io), 13 BST1 (io), 14 CLM (io), 15 MODE (io), 16 NC (io), 17 FB (io), 18 3V3 (power), 19 AGND (in)

## C_MP2950
designator ?  (value not drawn)
CDS_LMAN_SYM_OUTLINE: -300,800,300,-850; ROOM: NONE; OriginalSymbolOrigin: (-325,800); FP_TECH: ?; IP: ?; MATERIAL: ?; PACK_TYPE: ?; PART_NUMBER: ?; VARIANT: ?
pins: 1 CS6 (in), 2 CS5 (in), 3 CS4 (in), 4 CS3 (in), 5 CS2 (in), 6 CS1 (in), 7 VDIFF (out), 8 VFB (io), 9 VOSEN (in), 10 VORTN (in), 11 CSSUM (in), 12 IMON (io), 13 IREF (io), 14 VDD18 (power), 15 SCLK (in), 16 SDIO (io), 17 ALERT_N (out), 18 VRRDY (out), 19 VRHOT_N (out), 20 SDA_P (io), 21 SCL_P (in), 22 STB (out), 23 PE (in), 24 EN (in), 25 PWM6 (out), 26 PWM5 (out), 27 PWM4 (out), 28 PWM3 (out), 29 PWM2 (out), 30 PWM1 (out), 31 VDD33 (power) hidden to VDD33, 32 TEMP (in), 33 PSYS (in), 34 VIN_SEN (in), 35 AGND_TPD (in)